# Altium footprint library RPSLib_Connectors.PcbLib: 85 footprints (part 3 of 6)
Each footprint in its own frame and in the unit in brackets; x right, y up, seen from the top. Pads: shape width x height; smd on the part's side, far side on the other; paste and mask are expansions set on the pad; w line width, h text height; cw(c..) or ccw(c..) is an arc to the next point about the centre after c.
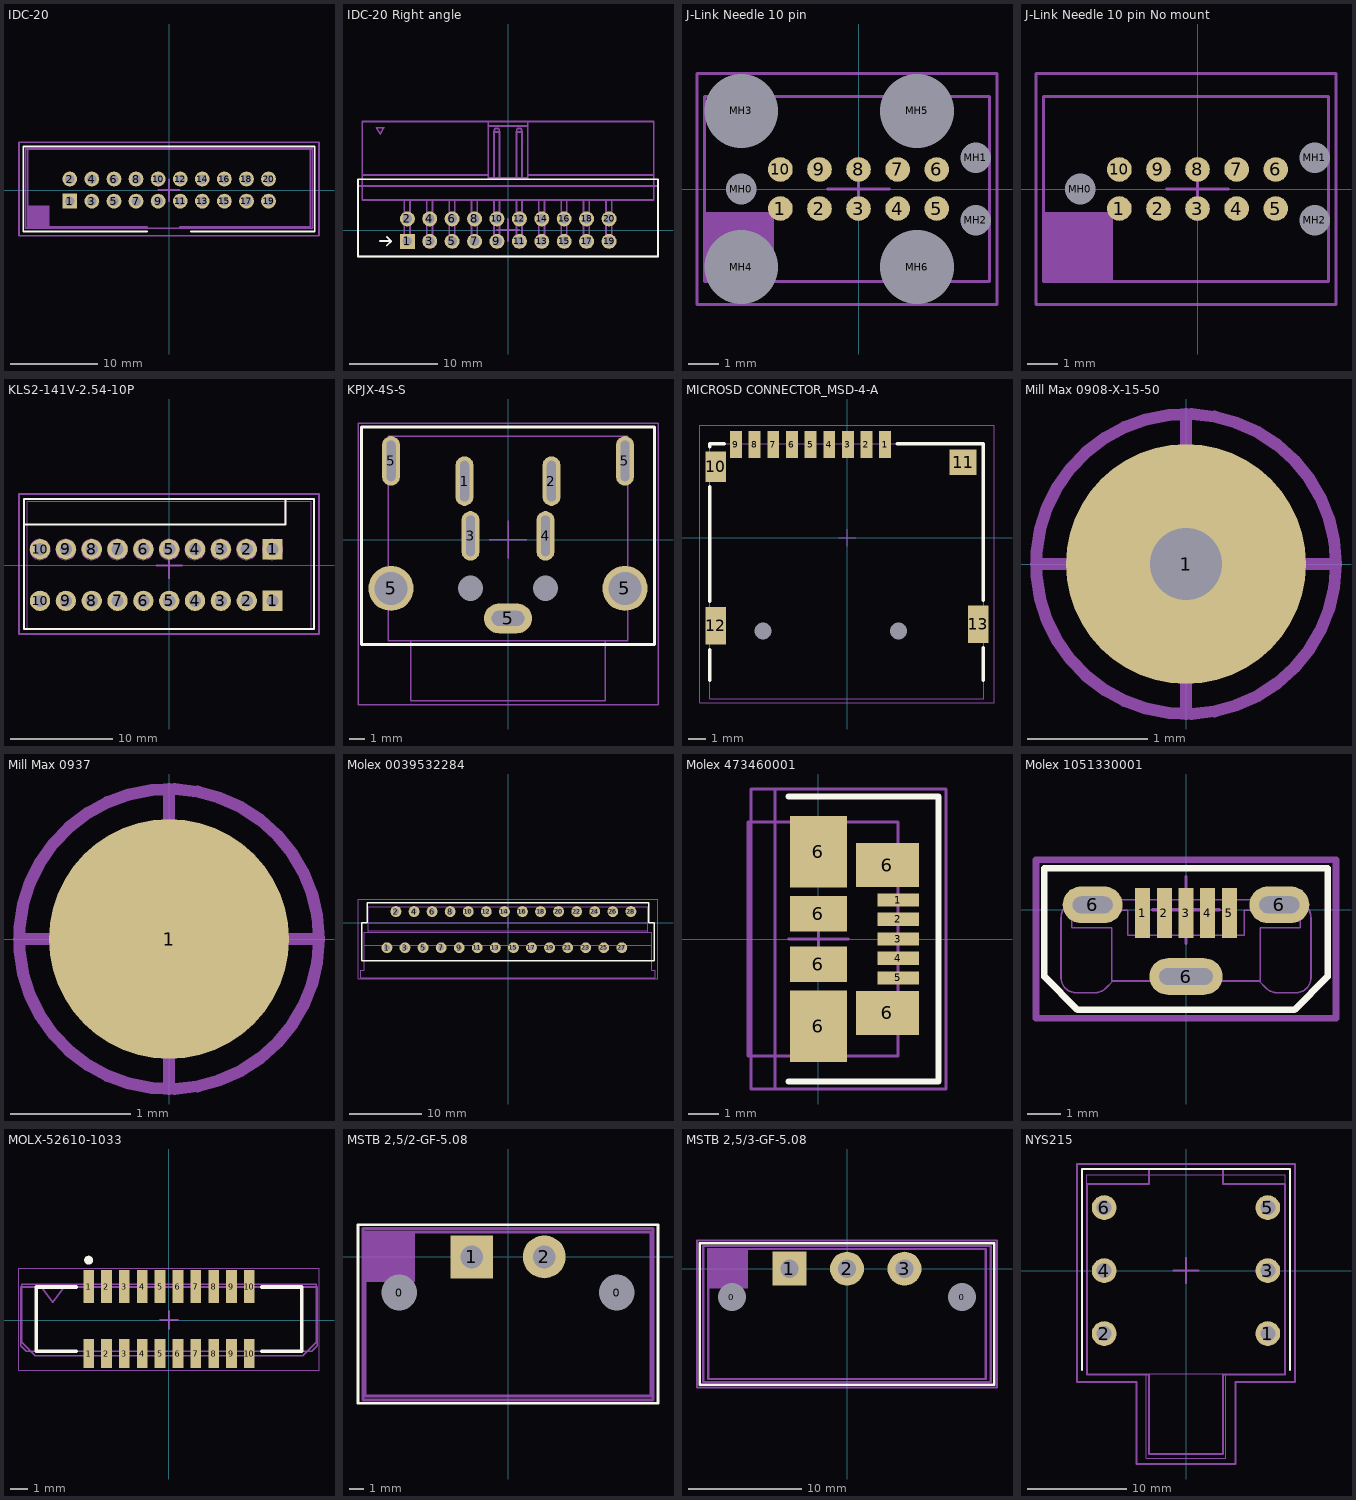
[diagram p2: the footprints below, top view; thin cyan lines are the x and y axes]

## IDC-20 [mm] "2.54 мм разъем"
height 9.1
pads (20):
  rect 1.7x1.7 hole 1.1: 1(-11.41,-1.27)
  round 1.7 hole 1.1: 2(-11.41,1.27) 3(-8.87,-1.27) 4(-8.87,1.27) 5(-6.33,-1.27) 6(-6.33,1.27) 7(-3.79,-1.27) 8(-3.79,1.27) 9(-1.25,-1.27) 10(-1.25,1.27) 11(1.29,-1.27) 12(1.29,1.27) 13(3.83,-1.27) 14(3.83,1.27) 15(6.37,-1.27) 16(6.37,1.27) 17(8.91,-1.27) 18(8.91,1.27) 19(11.45,-1.27) 20(11.45,1.27)
Top Overlay:
  lines w0.2: -2.5,-4.75 -16.75,-4.75 -16.75,5 16.75,5 16.75,-4.75 2.5,-4.75
Top Courtyard:
  lines w0.2: -1.25,0 1.25,0 ; 0,-1.25 0,1.25 ; -17.25,-5.25 17.25,-5.25 17.25,5.5 -17.25,5.5 -17.25,-5.25
Top 3D Body:
  lines w0.2: -16.51,-4.375 -16.51,4.725 16.51,4.725 16.51,-4.375 -16.51,-4.375
Top Assembly:
  rectangle: -16.25,-4.25 -13.75,-1.75
  lines w0.2: -2.5,-4.25 -16.25,-4.25 -16.25,4.75 16.25,4.75 16.25,-4.25 1.25,-4.25
  text ".Designator" at -2.868,-0.271 h1.2
3D body "IDC-20.stp": height 9.1, standoff -2.75, extent -16.51,-4.375 16.51,4.725

## IDC-20 Right angle [mm] "2.54 мм разъем правый"
height 9.1
pads (20):
  rect 1.7x1.7 hole 1.1: 1(-11.41,-1.27)
  round 1.7 hole 1.1: 2(-11.41,1.27) 3(-8.87,-1.27) 4(-8.87,1.27) 5(-6.33,-1.27) 6(-6.33,1.27) 7(-3.79,-1.27) 8(-3.79,1.27) 9(-1.25,-1.27) 10(-1.25,1.27) 11(1.29,-1.27) 12(1.29,1.27) 13(3.83,-1.27) 14(3.83,1.27) 15(6.37,-1.27) 16(6.37,1.27) 17(8.91,-1.27) 18(8.91,1.27) 19(11.45,-1.27) 20(11.45,1.27)
Top Overlay:
  lines w0.2: -14.5,-1.25 -13.25,-1.25 ; -13.75,-1.75 -13.25,-1.25 ; -13.75,-0.75 -13.25,-1.25 ; -17,-3 17,-3 17,5.75 -17,5.75 -17,-3
Top Designator:
  text ".Designator" at -2.868,-0.271 h1.2
Top Courtyard:
  lines w0.2: -1.25,0 1.25,0 ; 0,-1.25 0,1.25 ; -17,-3 -17,5 17,5 17,-3 -17,-3
Top 3D Body:
  lines w0.2: -16.51,6.25 -2.25,6.25 ; -11.75,3.41 -11.75,-0.65 -11.75,-1.59 -11.11,-1.59 -11.11,-0.65 -11.11,3.41 ; -9.21,3.41 -9.21,-0.65 -9.21,-1.59 -8.57,-1.59 -8.57,-0.65 -8.57,3.41 ; -6.67,3.41 -6.67,-0.65 -6.67,-1.59 -6.03,-1.59 -6.03,-0.65 -6.03,3.41 ; -4.13,3.41 -4.13,-0.65 -4.13,-1.59 -3.49,-1.59 -3.49,-0.65 -3.49,3.41 ; -2.25,11.81 2.25,11.81 ; -1.59,3.41 -1.59,-0.65 -1.59,-1.59 -0.95,-1.59 -0.95,-0.65 -0.95,3.41 ; -1.59,5.91 -1.59,11.11 ; -0.95,5.91 -0.95,11.11 ; 0.95,3.41 0.95,-0.65 0.95,-1.59 1.59,-1.59 1.59,-0.65 1.59,3.41 ; 0.95,5.91 0.95,11.11 ; 1.59,5.91 1.59,11.11 ; 2.25,6.25 16.51,6.25 ; 3.49,3.41 3.49,-0.65 3.49,-1.59 4.13,-1.59 4.13,-0.65 4.13,3.41 ; 6.03,3.41 6.03,-0.65 6.03,-1.59 6.67,-1.59 6.67,-0.65 6.67,3.41 ; 8.57,3.41 8.57,-0.65 8.57,-1.59 9.21,-1.59 9.21,-0.65 9.21,3.41 ; 11.11,3.41 11.11,-0.65 11.11,-1.59 11.75,-1.59 11.75,-0.65 11.75,3.41 ; -2.25,12.31 -16.51,12.31 -16.51,3.41 16.51,3.41 16.51,12.31 2.25,12.31 ; -2.25,12.31 2.25,12.31 ; -2.25,12.31 -2.25,5.91 2.25,5.91 2.25,12.31 ; -1.59,11.11 -1.49,11.51 -1.05,11.51 -0.95,11.11 ; -1.59,11.11 -0.95,11.11 ; 0.95,11.11 1.05,11.51 1.49,11.51 1.59,11.11 ; 0.95,11.11 1.59,11.11 ; -14.91,11.61 -14.06,11.61 -14.485,10.874 -14.91,11.61
3D body "IDC-20 Right angle v2.stp": height 9, standoff -2.8, extent -16.51,-1.59 16.51,12.31

## J-Link Needle 10 pin [mm]
pads (17):
  round 0.8 smd paste-1: 1(-2.54,-0.635) 2(-1.27,-0.635) 3(0,-0.635) 4(1.27,-0.635) 5(2.54,-0.635) 6(2.54,0.635) 7(1.27,0.635) 8(0,0.635) 9(-1.27,0.635) 10(-2.54,0.635)
  round 0.8 hole 1 unplated: MH0(-3.81,0) MH1(3.81,1.016) MH2(3.81,-1.016)
  round 0.8 hole 2.4 unplated: MH3(-3.81,2.54) MH4(-3.81,-2.54) MH5(1.905,2.54) MH6(1.905,-2.54)
Top Designator:
  rectangle: -5,-3 -2.75,-0.75
  lines w0.1: -5,-3 -5,3 4.25,3 4.25,-3 -5,-3
  text ".Designator" at -2.868,-0.271 h1.2
Top Courtyard:
  lines w0.1: -1,0 1,0 ; 0,-1 0,1 ; -5.25,-3.75 -5.25,3.75 4.5,3.75 4.5,-3.75 -5.25,-3.75
20:
  text ".Designator" at -1.126,-0.113 h0.5

## J-Link Needle 10 pin No mount [mm]
pads (13):
  round 0.8 smd paste-1: 1(-2.54,-0.635) 2(-1.27,-0.635) 3(0,-0.635) 4(1.27,-0.635) 5(2.54,-0.635) 6(2.54,0.635) 7(1.27,0.635) 8(0,0.635) 9(-1.27,0.635) 10(-2.54,0.635)
  round 0.8 hole 1 unplated mask+0.102: MH0(-3.81,0) MH1(3.81,1.016) MH2(3.81,-1.016)
Top Designator:
  rectangle: -5,-3 -2.75,-0.75
  lines w0.1: -5,-3 4.25,-3 4.25,3 -5,3 -5,-3
  text ".Designator" at -2.868,-0.271 h1.2
Top Courtyard:
  lines w0.1: -1,0 1,0 ; 0,-1 0,1 ; -5.25,-3.75 -5.25,3.75 4.5,3.75 4.5,-3.75 -5.25,-3.75
20:
  text ".Designator" at -1.126,-0.113 h0.5

## KLS2-141V-2.54-10P [mm] "Зажимной клеммник"
height 13
pads (20):
  rect 2x2 hole 1.2 unplated mask+0.07: 1(10.16,-3.5) 1(10.16,1.58)
  round 2 hole 1.2 unplated mask+0.07: 2(7.62,-3.5) 2(7.62,1.58) 3(5.08,-3.5) 3(5.08,1.58) 4(2.54,-3.5) 4(2.54,1.58) 5(0,-3.5) 5(0,1.58) 6(-2.54,-3.5) 6(-2.54,1.58) 7(-5.08,-3.5) 7(-5.08,1.58) 8(-7.62,-3.5) 8(-7.62,1.58) 9(-10.16,-3.5) 9(-10.16,1.58) 10(-12.7,-3.5) 10(-12.7,1.58)
Top Overlay:
  lines w0.2: -14.27,4 11.436,4 11.436,6.5 ; -14.27,-6.25 14.23,-6.25 14.23,6.5 -14.27,6.5 -14.27,-6.25
Top Designator:
  text ".Designator" at -2.868,-0.271 h1.2
Top Courtyard:
  lines w0.2: -1.25,0 1.25,0 ; 0,-1.25 0,1.25 ; -14.77,-6.75 14.73,-6.75 14.73,7 -14.77,7 -14.77,-6.75
Top 3D Body:
  circle w0.1: c-10.16,1.548 r1
  circle w0.1: c7.62,1.548 r1
  circle w0.1: c-7.62,1.548 r1
  circle w0.1: c5.08,1.548 r1
  circle w0.1: c2.54,1.548 r1
  circle w0.1: c-5.08,1.548 r1
  circle w0.1: c10.16,1.548 r1
  circle w0.1: c0,1.548 r1
  circle w0.1: c-12.7,1.548 r1
  circle w0.1: c-2.54,1.548 r1
  lines w0.1: -13.625,4.048 -12.355,4.048 -11.585,4.048 ; -11.085,4.048 -9.815,4.048 -9.045,4.048 ; -8.545,4.048 -7.275,4.048 -6.505,4.048 ; -6.005,4.048 -4.735,4.048 -3.965,4.048 ; -3.465,4.048 -2.195,4.048 -1.425,4.048 ; -0.925,4.048 0.345,4.048 1.115,4.048 ; 1.615,4.048 2.885,4.048 3.655,4.048 ; 4.155,4.048 5.425,4.048 6.195,4.048 ; 6.695,4.048 7.965,4.048 8.735,4.048 ; 9.235,4.048 10.505,4.048 11.275,4.048 ; -13.97,4.048 -13.97,-6.3 13.97,-6.3 13.97,6.3 11.43,6.3 ; -13.97,4.048 11.43,4.048 11.43,6.3 ; -13.97,4.048 -13.97,6.3 11.43,6.3
3D body "KLS2-141V-10P.stp": height 13.6, standoff -3.5, extent -13.97,-6.3 13.97,6.3

## KPJX-4S-S [mm]
pads (11):
  oval 1.2x3.3 hole 0.6 slot 2.7 at 90 deg: 1(-2.9,3.9) 2(2.9,3.9) 3(-2.5,0.25) 4(2.5,0.25) 5(-7.8,5.25) 5(7.8,5.25)
  round 3 hole 2.2: 5(-7.8,-3.25) 5(7.8,-3.25)
  oval 3.2x2 hole 2.2 slot 1 at 90 deg: 5(0,-5.25)
  oval 0.8x0.725 hole 1.7 unplated mask+0.07: MH0(-2.5,-3.25) MH1(2.5,-3.25)
Top Overlay:
  lines w0.2: -9.75,-7 9.75,-7 9.75,7.5 -9.75,7.5 -9.75,-7
Top Designator:
  text ".Designator" at -2.868,-0.271 h1.2
Top Courtyard:
  lines w0.1: -1.25,0 1.25,0 ; 0,-1.25 0,1.25 ; -10,-11 -10,7.75 10,7.75 10,-11 -10,-11
Top 3D Body:
  lines w0.1: -6.5,-6.75 -8,-6.75 -8,6.9 8,6.9 8,-6.75 6.5,-6.75 ; -6.5,-6.75 -6.5,-10.75 6.5,-10.75 6.5,-6.75 ; -6.5,-6.75 6.5,-6.75
3D body "KPJX-4S-S.stp": height 15, standoff -3.5, extent -8,-10.75 8,6.9

## MICROSD CONNECTOR_MSD-4-A [mm] "Micro SD Card Connector, 9 Positions, Connector and Ejector, Push In, Auto Eject Out, Surface Mount, 1.8 mm Height Above Board, Gold Flash"
height 2
pads (15):
  rect 0.7x1.6 smd: 1(2.25,5.5) 2(1.15,5.5) 3(0.05,5.5) 4(-1.05,5.5) 5(-2.15,5.5) 6(-3.25,5.5) 7(-4.35,5.5) 8(-5.45,5.5) 9(-6.55,5.5)
  rect 1.2x1.8 smd: 10(-7.75,4.2)
  rect 1.6x1.5 smd: 11(6.85,4.45)
  rect 1.2x2.2 smd: 12(-7.75,-5.2) 13(7.75,-5.1)
  round 0 hole 1: 19(-4.95,-5.5) 19(3.05,-5.5)
Top Overlay:
  lines w0.2: -8.1,-8.416 -8.1,-6.6 ; -8.1,-3.75 -8.1,3 ; -8.1,5.35 -8.1,5.55 -7.25,5.55 ; 2.95,5.55 8.05,5.55 8.05,-3.7 ; 8.05,-8.416 8.05,-6.5
Top Courtyard:
  lines w0.05: -0.498,-0.002 0.502,-0.002 ; 0,-0.5 0,0.5 ; -8.7,-9.75 8.7,-9.75 8.7,6.65 -8.7,6.65 -8.7,-9.75
Top Assembly:
  lines w0.05: -8.095,-9.5 8.055,-9.5 8.055,5.55 -8.095,5.55 -8.095,-9.5
  text ".Designator" at -4.998,-0.333 h1
3D body "CUI_DEVICES_MSD-4-A.step": height 1.86, standoff -0.54, extent -8.095,-9.5 8.055,5.55

## Mill Max 0908-X-15-50 [mm] "Mill Max Long stroke, Hole mount"
height 11
pads (1):
  round 2 hole 0.6 mask+0.07: 1(0,0)
Top Designator:
  text ".Designator" at -2.868,-0.271 h1.2
Top Courtyard:
  circle w0.1: c0,0 r1.25
  lines w0.1: -1.25,0 1.25,0 ; 0,-1.25 0,1.25
Top 3D Body:
  circle w0.1: c0,0 r0.915
3D body: height 10.9, standoff 0, extent -0.75,-0.75 0.75,0.75

## Mill Max 0937 [mm] "Mill Max Long stroke, Surface mount"
height 11
pads (1):
  round 2 smd mask+0.07: 1(0,0)
Top Designator:
  text ".Designator" at -2.868,-0.271 h1.2
Top Courtyard:
  circle w0.1: c0,0 r1.25
  lines w0.1: -1.25,0 1.25,0 ; 0,-1.25 0,1.25
Top 3D Body:
  circle w0.1: c0,0 r0.915
3D body "0937-0-15-20-77-14-11-0 Contact.stp": height 10.05, standoff 0, extent -0.908,-0.913 0.915,0.913

## Molex 0039532284 [mm] "CONN FFC TOP 28POS 1.25MM R/A"
height 5
pads (28):
  round 1.5 hole 0.8 mask+0.07: 1(-16.75,-3.45) 2(-15.5,1.55) 3(-14.25,-3.45) 4(-13,1.55) 5(-11.75,-3.45) 6(-10.5,1.55) 7(-9.25,-3.45) 8(-8,1.55) 9(-6.75,-3.45) 10(-5.5,1.55) 11(-4.25,-3.45) 12(-3,1.55) 13(-1.75,-3.45) 14(-0.5,1.55) 15(0.75,-3.45) 16(2,1.55) 17(3.25,-3.45) 18(4.5,1.55) 19(5.75,-3.45) 20(7,1.55) 21(8.25,-3.45) 22(9.5,1.55) 23(10.75,-3.45) 24(12,1.55) 25(13.25,-3.45) 26(14.5,1.55) 27(15.75,-3.45) 28(17,1.55)
Top Overlay:
  lines w0.2: -20.25,-5.25 20.25,-5.25 20.25,0 19.5,0 19.5,2.75 -19.5,2.75 -19.5,0 -20.25,0 -20.25,-5.25
Top Designator:
  text ".Designator" at -2.868,-0.271 h1.2
Top Courtyard:
  lines w0.1: -0.75,0 0.75,0 ; 0,-0.75 0,0.75 ; -20.75,-7.75 -20.75,3.25 20.75,3.25 20.75,-7.75 -20.75,-7.75
Top 3D Body:
  lines w0.05: -19.325,-1.3 -19.325,-1.1 ; 19.325,-1.3 19.325,-1.1 ; -19.325,-1.1 19.325,-1.1 ; -19.325,-1.1 -19.325,2.2 19.325,2.2 19.325,-1.1 ; -20.375,-7.6 20.375,-7.6 20.375,-6.6 19.875,-6.6 19.875,-1.3 -19.875,-1.3 -19.875,-6.6 -20.375,-6.6 -20.375,-7.6
21:
  circle w0.05: c-16.75,-3.45 r0.4
  circle w0.05: c-15.5,1.55 r0.4
  circle w0.05: c-13,1.55 r0.4
  circle w0.05: c-11.75,-3.45 r0.4
  circle w0.05: c-9.25,-3.45 r0.4
  circle w0.05: c-6.75,-3.45 r0.4
  circle w0.05: c-5.5,1.55 r0.4
  circle w0.05: c-3,1.55 r0.4
  circle w0.05: c-0.5,1.55 r0.4
  circle w0.05: c0.75,-3.45 r0.4
  circle w0.05: c3.25,-3.45 r0.4
  circle w0.05: c4.5,1.55 r0.4
  circle w0.05: c7,1.55 r0.4
  circle w0.05: c9.5,1.55 r0.4
  circle w0.05: c10.75,-3.45 r0.4
  circle w0.05: c13.25,-3.45 r0.4
  circle w0.05: c15.76,-3.45 r0.4
  circle w0.05: c17,1.55 r0.4
  circle w0.05: c-14.25,-3.45 r0.4
  circle w0.05: c-10.5,1.55 r0.4
  circle w0.05: c-1.75,-3.45 r0.4
  circle w0.05: c-4.25,-3.45 r0.4
  circle w0.05: c-8,1.55 r0.4
  circle w0.05: c5.75,-3.45 r0.4
  circle w0.05: c2,1.55 r0.4
  circle w0.05: c8.25,-3.45 r0.4
  circle w0.05: c12,1.55 r0.4
  circle w0.05: c14.5,1.55 r0.4
  lines w0.05: -19.875,-7.6 19.875,-7.6 ; -19.875,-3.1 19.875,-3.1 ; -19.325,0 19.325,0
3D body "Molex FPC.stp": height 5.4, standoff -3.5, extent -20.375,-7.6 20.375,2.2

## Molex 473460001 [mm]
height 2.5
pads (11):
  rect 1.38x0.45 smd mask+0.07: 1(2.66,1.3) 2(2.66,0.65) 3(2.66,0) 4(2.66,-0.65) 5(2.66,-1.3)
  rect 1.9x2.38 smd mask+0.07: 6(0,-2.912) 6(0,2.912)
  rect 1.9x1.18 smd mask+0.07: 6(0,-0.837) 6(0,0.838)
  rect 2.1x1.47 smd mask+0.07: 6(2.3,-2.462) 6(2.3,2.463)
Top Overlay:
  lines w0.2: -1,-4.75 4,-4.75 4,4.75 -1,4.75
Top Designator:
  text ".Designator" at -2.868,-0.271 h1.2
Top Courtyard:
  lines w0.1: -1.45,-5 -1.45,5 ; -1,0 1,0 ; 0,-1 0,1 ; -2.25,-5 4.25,-5 4.25,5 -2.25,5 -2.25,-5
Top 3D Body:
  lines w0.1: -2.35,-3.9 -2.35,3.9 2.65,3.9 2.65,-3.9 -2.35,-3.9
3D body "Molex 47346-001.stp": height 2.68, standoff -0.03, extent -2.35,-3.9 2.65,3.9

## Molex 1051330001 [mm] "Micro USB-B Vertical"
height 6
pads (8):
  rect 0.45x1.5 smd mask+0.07: 1(-1.3,-0.1) 2(-0.65,-0.1) 3(0,-0.1) 4(0.65,-0.1) 5(1.3,-0.1)
  oval 1.8x1.1 hole 0.5 slot 1.2 at 0 deg mask+0.07: 6(-2.8,0.15) 6(2.8,0.15)
  oval 2.2x1.1 hole 0.5 slot 1.6 at 0 deg mask+0.07: 6(0,-2)
Top Overlay:
  lines w0.2: -4.25,-2 -4.25,1.25 4.25,1.25 4.25,-2 3.25,-3 -3.25,-3 -4.25,-2
Top Designator:
  text ".Designator" at -2.868,-0.271 h1.2
Top Courtyard:
  lines w0.1: -1,0 1,0 ; 0,-1 0,1
  lines w0.2: -4.5,-3.25 -4.5,1.5 4.5,1.5 4.5,-3.25 -4.5,-3.25
Top 3D Body:
  lines w0.05: -1.425,0.3 -1.425,0.39 -1.175,0.39 -1.175,0.3 ; -0.775,0.3 -0.775,0.39 -0.525,0.39 -0.525,0.3 ; -0.125,0.3 -0.125,0.39 0,0.39 0.125,0.39 0.125,0.3 ; 0.525,0.3 0.525,0.39 0.775,0.39 0.775,0.3 ; 1.175,0.3 1.175,0.39 1.425,0.39 1.425,0.3 ; -2.23,-2.135 -0.6,-2.135 -0.6,-1.85 0,-1.85 0.6,-1.85 0.6,-2.135 2.23,-2.135 ; -2.23,-2.135 -2.23,-0.535 -3.43,-0.535 -3.43,-0.365 cw(c-3.08,-0.365) -3.08,-0.015 -1.75,-0.015 -1.75,-0.76 -1.425,-0.76 -1.175,-0.76 -0.775,-0.76 -0.525,-0.76 -0.125,-0.76 0,-0.76 0.125,-0.76 0.525,-0.76 0.775,-0.76 1.175,-0.76 1.425,-0.76 1.75,-0.76 1.75,-0.015 3.08,-0.015 cw(c3.08,-0.365) 3.43,-0.365 3.43,-0.535 2.23,-0.535 2.23,-2.135 ; -2.23,-2.135 -2.19,-2.135 -2.408,-2.353 cw(c-2.726,-2.035) -2.726,-2.485 -2.75,-2.485 -3.3,-2.485 cw(c-3.3,-2.035) -3.75,-2.035 -3.75,-0.25 cw(c-3.2,-0.25) -3.33,0.284 -3.05,0.3 -2.55,0.3 0,0.3 2.55,0.3 3.05,0.3 3.33,0.284 cw(c3.2,-0.25) 3.75,-0.25 3.75,-2.035 cw(c3.3,-2.035) 3.3,-2.485 2.75,-2.485 2.726,-2.485 cw(c2.726,-2.035) 2.408,-2.353 2.19,-2.135 2.23,-2.135
3D body "1051330001.stp": height 6.66, standoff -2.35, extent -4.025,-2.485 3.975,0.53

## MOLX-52610-1033 [mm] "FPC Connector, 10-Leads, Vertical, Pitch 1.0 mm, Mated Height 5.75 mm, SMT"
height 5.762
pads (20):
  rect 0.6x1.65 smd: 1(-4.5,-1.875) 2(-3.5,-1.875) 3(-2.5,-1.875) 4(-1.5,-1.875) 5(-0.5,-1.875) 6(0.5,-1.875) 7(1.5,-1.875) 8(2.5,-1.875) 9(3.5,-1.875) 10(4.5,-1.875)
  rect 0.6x1.85 smd: 1(-4.5,1.875) 2(-3.5,1.875) 3(-2.5,1.875) 4(-1.5,1.875) 5(-0.5,1.875) 6(0.5,1.875) 7(1.5,1.875) 8(2.5,1.875) 9(3.5,1.875) 10(4.5,1.875)
Top Overlay:
  circle w0.25: c-4.5,3.35 r0.125
  lines w0.2: -5.2,-1.75 -7.425,-1.75 -7.425,1.85 -5.2,1.85 ; 5.2,1.85 7.425,1.85 7.425,-1.75 5.2,-1.75
Top Designator:
  lines w0.1: -7.257,2 -6.5,1 -5.743,2 ; -8.25,-1.25 -7.5,-2 7.5,-2 8.25,-1.25 8.25,2 -8.25,2 -8.25,-1.25
  text ".Designator" at -2.868,-0.271 h1.2
Top Courtyard:
  lines w0.05: -8.4,-2.8 8.4,-2.8 8.4,2.9 -8.4,2.9 -8.4,-2.8
  lines w0.1: -0.5,0 0.5,0 ; 0,-0.5 0,0.5
Top 3D Body:
  lines w0.1: -7.425,-1.75 -7.425,1.85 ; 7.425,-1.75 7.425,1.85 ; -8.3,-1.45 -8,-1.75 8,-1.75 8.3,-1.45 8.3,1.85 -8.3,1.85 -8.3,-1.45
20:
  text ".Designator" at -1.126,-0.113 h0.5
3D body "526101033.stp": height 5.76, standoff 0.01, extent -8.3,-2.24 8.3,2.26

## MSTB 2,5/2-GF-5.08 [mm]
pads (4):
  round 1 hole 2.5 unplated: 0(-7.62,-2.5) 0(7.62,-2.5)
  rect 3x3 hole 1.6: 1(-2.54,0)
  round 3 hole 1.6: 2(2.54,0)
Top Overlay:
  lines w0.2: -10.5,-10.25 -10.5,2.25 10.5,2.25 10.5,-10.25 -10.5,-10.25
Top Designator:
  rectangle: -10,-1.75 -6.5,1.75
  lines w0.2: -10,-9.75 -10,1.75 10,1.75 10,-9.75 -10,-9.75
  text ".Designator" at -2.868,-0.271 h1.2
Top 3D Body:
  lines w0.2: -10.16,-10.01 -10.16,1.992 10.16,1.992 10.16,-10.01 -10.16,-10.01
20:
  text ".Designator" at -4.506,-2.452 h2
3D body "MSTB 2,52-GF-5.08.stp": height 8.6, standoff -3.5, extent -10.16,-10 10.16,2.002

## MSTB 2,5/3-GF-5.08 [mm]
pads (5):
  round 1 hole 2.5 unplated: 0(-10.16,-2.5) 0(10.16,-2.5)
  rect 3x3 hole 1.6: 1(-5.08,0)
  round 3 hole 1.6: 2(0,0) 3(5.08,0)
Top Overlay:
  lines w0.2: -13,-10.25 13,-10.25 13,2.25 -13,2.25 -13,-10.25
Top Designator:
  rectangle: -12.25,-1.75 -8.75,1.75
  lines w0.2: -12.25,-9.75 12.25,-9.75 12.25,1.75 -12.25,1.75 -12.25,-9.75
  text ".Designator" at -2.868,-0.271 h1.2
Top 3D Body:
  lines w0.2: -12.7,-10 12.7,-10 12.7,2.002 -12.7,2.002 -12.7,-10
Bottom 3D Body:
  lines w0.2: -1,0 1,0 ; 0,-1 0,1 ; -13.25,-10.5 13.25,-10.5 13.25,2.5 -13.25,2.5 -13.25,-10.5
20:
  text ".Designator" at -4.506,-2.452 h2
3D body "MSTB 2,5-3-GF-5.08.stp": height 8.6, standoff -3.5, extent -12.7,-10 12.7,2.002

## NYS215 [mm] "1/4 Phone Jack"
height 15.5
pads (6):
  round 2.5 hole 1.5 mask+0.07: 1(8.25,-6.35) 2(-8.25,-6.35) 3(8.25,0) 4(-8.25,0) 5(8.25,6.35) 6(-8.25,6.35)
Top Overlay:
  lines w0.2: -10.5,-10 -10.5,10.25 10.5,10.25 10.5,-10
Top Designator:
  lines w0.2: -10,-10.5 -3.75,-10.5 -3.75,-18.5 3.75,-18.5 3.75,-10.5 10,-10.5 10,8.75 3.75,8.75 3.75,10.25 -3.75,10.25 -3.75,8.75 -10,8.75 -10,-10.5
  text ".Designator" at -2.868,-0.271 h1.2
Top Courtyard:
  lines w0.2: -1.25,0 1.25,0 ; 0,-1.25 0,1.25 ; -11,-11.25 -11,10.75 11,10.75 11,-11.25 5,-11.25 5,-19.5 -5,-19.5 -5,-11.25 -11,-11.25
Top 3D Body:
  lines w0.1: -4,-10.4 -4,-18.9 4,-18.9 4,-10.4 ; -10,-10.4 -10,9.65 10,9.65 10,-10.4 -10,-10.4
20:
  text ".Designator" at -4.506,-0.452 h2
3D body "NYS215.stp": height 15.5, standoff 0, extent -10,-13.35 10,15.15